# Altium schematic symbol library lib_datalogger.SchLib: 1246 symbols (part 4 of 16) (continued)
## CMP-005-000001-1 (continued)

## CMP-005-00001-4
designator F?, comment MF-MSMF050-2
PTC Resettable Fuse, 15 V, 500 mA, -40 to 85 degC, 2-Pin SMD, RoHS, Tape and Reel; Manufacturer: Bourns; Nominal Supply Voltage: 15V; Current Rating: 100A; Resistance: 150mohm; Datasheet URL: http://www.bourns.com/docs/Product-Datasheets/mfmsmf.pdf; Packaging: TapeandReel; Package Description: 2-Pin Surface Mount Device, Body 4.55 x 3.24 mm; RoHS Compliant: True; Package Quantity: 2000; Lead Pitch: 4.73mm; Datasheet Version: Rev. AG, 08/2016; Max Operating Temperature: 85°C; Voltage Rating: 15V; Mounting Technology: SM; Case/Package: 1812; Min Operating Temperature: -40°C; Package Reference: MF-MSMF050-2
footprint BOUR-MF-MSMF050-2_V (SMD, 2-Leads, Body 4.55x3.24mm)
pins: 1, 2

## CMP-00005-2
designator CLUSTER LED?, comment CLUSTER LED
Round 503-B Series Led -blue Color, Full Rank, Bulk Pack; Lens Color: Colorless; Lens Transparency: Clear; Viewing Angle: 30°; Wavelength: 591nm; Power Dissipation: 130mW; Forward Current: 20mA; Lens Style: Dome,Round; Number of LEDs: 1; Reverse Voltage: 5V; Illumination Color: Orange; Forward Voltage: 2.1V; Dominant Wavelength: 596nm; Luminous Intensity: 6000mcd; REACH SVHC: Unknown; Color: Orange; Packaging: Tape and Reel; Radiation Hardening: No; Mount: Through Hole; Depth: 5.8mm; Case/Package: Radial; Series: -; RoHS Compliant: Yes; Min Operating Temperature: -40°C; Width: 0.5inch; Height: 10.1mm; Package Quantity: 2500; Test Current: 20mA; Number of Pins: 2; Number of Elements: 1; Max Operating Temperature: 100°C; Length: 5.8mm; Weight: 0.01lb
footprint CLUSTER LED-Footprint-1
pins: AC A1, KG1 A2, KG2 B2, KG3 C2, KG4 D2
text: 234R; 127R; 3; 4

## CMP-005-000002-1
designator CON?, comment CONN DG250
PCB Spring Terminal Blocks DG250-5.0; Manufacturer 1: DEGSON; Manufacturer Part Number 1: DG250T-5.0-16P-14-00AH; Reated connection: 2.5 mm²; Reated courent: 12A; Pitch: 5.0 mm²; Ambient trmperature: -40~+95; Reated voltage: 450V; Poles: 2*(1P-XXP); Design Item ID: CONN DG250; Source: mits.SchLib
footprint DG250
footprint DG250
pins: 1, 2, 3, 4, 5, 6, 7, 8, 9, 10, 11, 12, 13, 14

## CMP-005-00002-4
designator F?, comment MF-MSMF075-2
PTC Resettable Fuse, 13.2 V, 750 mA, -40 to 85 degC, 2-Pin SMD, RoHS, Tape and Reel; Manufacturer: Bourns; Resistance: 450mohm; Current Rating: 100A; Voltage Rating: 13.2V; Package Reference: MF-MSMF050-2; Mounting Technology: SM; Max Operating Temperature: 85°C; Package Quantity: 2000; Min Operating Temperature: -40°C; Case/Package: 1812; Packaging: TapeandReel; Package Description: 2-Pin Surface Mount Device, Body 4.55 x 3.24 mm; Lead Pitch: 4.73mm; Nominal Supply Voltage: 13.2V; Datasheet Version: Rev. AG, 08/2016; Datasheet URL: http://www.bourns.com/docs/Product-Datasheets/mfmsmf.pdf; RoHS Compliant: True
footprint BOUR-MF-MSMF050-2_V (SMD, 2-Leads, Body 4.55x3.24mm)
pins: 1, 2

## CMP-005-000003-1
designator CON?, comment CONN XT60 60A
Conector XT60 M 60A; Manufacturer 1: AMASS; Manufacturer Part Number 1: XT60-M; Kind of connector: MALE; Connector series: DC Supply; Design Item ID: CONN XT60 60A; Source: mits.SchLib; Number of pins: 2; Current rating: 60A
footprint MSTBA 2G
footprint XT60 3MM
pins: 1, 2

## CMP-005-00003-4
designator F?, comment MF-MSMF110/24X-2
PTC Resettable Fuse, 24 V, 1.1 A, -40 to 85 degC, 2-Pin SMD, RoHS, Tape and Reel; Manufacturer: Bourns; Resistance: 0.18Ohm; Current Rating: 20A; Nominal Supply Voltage: 24V; Max Operating Temperature: 85°C; Package Description: 2-Pin Surface Mount Device, Body 4.6 x 3.24 mm; Packaging: TapeandReel; Datasheet URL: http://www.bourns.com/docs/Product-Datasheets/mfmsmf.pdf; RoHS Compliant: True; Mounting Technology: SM; Case/Package: 1812; Package Reference: MF-MSMF110-24X-2; Datasheet Version: Rev. AG, 08/2016; Voltage Rating: 24V; Min Operating Temperature: -40°C
footprint BOUR-MF-MSMF110-24X-2_V (Chip Fuse, 2-Leads, Body 4.6x3.24mm)
pins: 1, 2

## CMP-005-000004-1
designator J?, comment CONECTOR USB B
CONN USB RTANG FEMALE TYPE B PCB; Manufacturer: Assmann WSW Components; Part#: AU-Y1007-R; MSRP: 0,36685; eVendor#: AE9925-ND; eVendorPrice: 0,73; eVendor: Digi-Key; Design Item ID: CONECTOR USB B; Source: mits.SchLib; MOQ: 2500; Datasheet: http://www.assmann.us/specs/AU-Y1007-R.pdf
footprint CONECTOR_USB_B_RA (Connector)
footprint CONECTOR_USB_B_RA (Connector)
pins: 1 VBUS, 2 D-, 3 D+, 4 GND, SH SHIELD

## CMP-005-00004-3
designator F?, comment 1812L050PR
POLY-FUSE(R) Resettable PTC, 15 V, 0.5 A, -40 to 85 degC, 2-Pin SMD, RoHS, Tape and Reel; Manufacturer: Littelfuse; Nominal Supply Voltage: 15V; Resistance: 1Ohm; Current Rating: 100A; Min Operating Temperature: -40°C; Package Description: 2-Pin Surface Mount Device, Body 4.55 x 3.24 mm; Package Quantity: 1; RoHS Compliant: True; Datasheet Version: Feb-16; Datasheet URL: http://www.littelfuse.com/~/media/electronics/datasheets/resettable_ptcs/littelfuse_ptc_1812l_datasheet.pdf.pdf; Case/Package: 1812; Packaging: TapeandReel; Voltage Rating: 15V; Max Operating Temperature: 85°C; Package Reference: 1812; Mounting Technology: SM
footprint LFUS-466_V (SMD, 2-Leads, Body 3.175x1.524mm)
footprint LFUS-1812L050_V (Chip Fuse, 2-Leads, Body 4.73x3.41mm)
pins: 1, 2

## CMP-005-000005-1
designator CON?, comment EURO 96 TIPO C
CONN DIN PLUG 64POS RT ANG PCB; Manufacturer Part Number: 5536356-5; Manufacturer: TE Connectivity AMP Connectors; Pitch: 0.100" (2.54mm); Material Flammability Rating: UL94 V-0; Number of Positions Loaded: 64; Material - Insulation: Polymer Thermoplastic, Glass Filled; Level, Class: 2; Connector Type: Plug, Male Pins; Number of Positions: 96; Stock 1: 71; RoHS: RoHS Compliant; Style: C; ComponentLink1URL: http://www.te.com/commerce/DocumentDelivery/DDEController?Action=srchrtrv&DocNm=5536356&DocType=Customer+Drawing&DocLang=English; Design Item ID: EURO 96 TIPO C; Features: Board Lock; Category: Connectors, Interconnects; Packaging: Bulk; Part Status: Active; Pricing 1: 1=5.87, 25=5.86, 50=4.84, 100=4.03, 250=3.46, 500=3.1 (USD); Source: mits.SchLib; Operating Temperature: -55°C ~ 125°C; Number of Rows: 3; Contact Finish Thickness: -; ComponentLink1Description: http://www.te.com/commerce/DocumentDelivery/DDEController?Action=srchrtrv&DocNm=5536356&DocType=Customer+Drawing&DocLang=English; Mounting Type: Through Hole, Right Angle; Current rating: -; Termination: Solder; Contact Finish: Gold
footprint Euro 96-64 RECEPTOR
footprint Euro 96 tipo C
part A pins: a1, a2, a3, a4, a5, a6, a7, a8, a9, a10, a11, a12, a13, a14, a15, a16, a17, a18, a19, a20, a21, a22, a23, a24, a25, a26, a27, a28, a29, a30, a31, a32
part B pins: b1, b2, b3, b4, b5, b6, b7, b8, b9, b10, b11, b12, b13, b14, b15, b16, b17, b18, b19, b20, b21, b22, b23, b24, b25, b26, b27, b28, b29, b30, b31, b32
part C pins: c1, c2, c3, c4, c5, c6, c7, c8, c9, c10, c11, c12, c13, c14, c15, c16, c17, c18, c19, c20, c21, c22, c23, c24, c25, c26, c27, c28, c29, c30, c31, c32

## CMP-005-00005-3
designator F?, comment 1812L075PR
POLY-FUSE(R) Resettable PTC, 13.2 V, 0.75 A, -40 to 85 degC, 2-Pin SMD, RoHS, Tape and Reel; Manufacturer: Littelfuse; Current Rating: 100A; Resistance: 450mohm; Nominal Supply Voltage: 13.2V; Mounting Technology: SM; Min Operating Temperature: -40°C; Package Quantity: 2000; Datasheet URL: http://www.littelfuse.com/~/media/electronics/datasheets/resettable_ptcs/littelfuse_ptc_1812l_datasheet.pdf.pdf; Package Description: 2-Pin Surface Mount Device, Body 4.55 x 3.24 mm; Datasheet Version: Feb-16; RoHS Compliant: True; Packaging: TapeandReel; Package Reference: 1812; Case/Package: 1812; Max Operating Temperature: 85°C
footprint LFUS-466_V (SMD, 2-Leads, Body 3.175x1.524mm)
footprint LFUS-1812L075_V (Chip Fuse, 2-Leads, Body 4.73x3.41mm)
pins: 1, 2

## CMP-005-000006-1
designator CON?, comment CONN BASE NEMA 7POS
LED Lighting Fixture Accessories; LIGHTCONTROLLER BASE ASSEMBLY; 76MM DIA; Manufacturer: TE Connectivity; Manufacturer Part Number: 2213730-1; Sealable: Yes (With); Number of Positions: 7; Connector Type: Plug; Design Item ID: CONN BASE NEMA 7POS; RoHS: Yes; Supplier Unit Price 2: 10.45; Pricing 1: 1=10,95000, 10=7,94200, 100=6,56270, 500=5,91520 (USD); ComponentLink1URL: https://www.te.com/commerce/DocumentDelivery/DDEController?Action=srchrtrv&DocNm=2213730&DocType=Customer+Drawing&DocLang=English&src-supplier=Digi-Key; ComponentLink2URL: http://www.farnell.com/datasheets/2079116.pdf?src-supplier=Element14; ComponentLink2Description: http://www.farnell.com/datasheets/2079116.pdf?src-supplier=Element14; Stock 1: 512; Category: Cables and Wire; Source: mits.SchLib; REACH SVHC: Unknown; ComponentLink1Description: https://www.te.com/commerce/DocumentDelivery/DDEController?Action=srchrtrv&DocNm=2213730&DocType=Customer+Drawing&DocLang=English&src-supplier=Digi-Key
footprint BASE NEMA 7PIN
footprint BASE NEMA 7PIN
pins: 1 BRN, 2 GRAY (-), 3 VIO (+), 4 ORA, 5 LI, 6 LO, 7 N

## CMP-005-00006-3
designator F?, comment 1812L160/12DR
POLY-FUSE(R) Resettable PTC, 12 V, 1.6 A, -40 to 85 degC, 2-Pin SMD, RoHS, Tape and Reel; Manufacturer: Littelfuse; Resistance: 100mohm; Current Rating: 100A; Nominal Supply Voltage: 12V; Max Operating Temperature: 85°C; Case/Package: 1812; Package Quantity: 1500; Datasheet URL: http://www.littelfuse.com/~/media/electronics/datasheets/resettable_ptcs/littelfuse_ptc_1812l_datasheet.pdf.pdf; Package Description: 2-Pin Surface Mount Device, Body 4.55 x 3.24 mm; Package Reference: 1812; Packaging: TapeandReel; Datasheet Version: Feb-16; Min Operating Temperature: -40°C; Mounting Technology: SM; RoHS Compliant: True
footprint LFUS-466_V (SMD, 2-Leads, Body 3.175x1.524mm)
footprint LFUS-1812L16012_V (Chip Fuse, 2-Leads, Body 4.73x3.41mm)
pins: 1, 2

## CMP-005-000007-1
designator CON?, comment CONN HEADER 6POS 2X3
VERTICAL PIN HEADER GOLD+TIN; Manufacturer Part Number: M20-9760342; Manufacturer: Harwin; Connector Type: Male Pin; Max Current Rating: 3A; Contact Resistance: 25mR; Voltage Rating: 750V; Gender: Male; Number of Contacts: 6; Pitch: 2.54mm; Row Spacing: 0.1inch; Source: mits.SchLib; Number of Rows: 2; Contact Material: Brass; Design Item ID: CONN HEADER 6POS 2X3; Mount: Through Hole; Min Operating Temperature: -40°C; Depth: 5.08mm; ComponentLink3URL: https://datasheet.ciiva.com/16733/m20-976-16733096.pdf?src-supplier=Avnet+Europe; ComponentLink1URL: https://datasheet.ciiva.com/26899/getdatasheetpartid-501523-26899404.pdf?src-supplier=Verical; RoHS: Yes; Pricing 1: 1=0,28000, 10=0,25900, 100=0,17940, 500=0,15180, 1000=0,12420, 5000=0,11040, 10000=0,10005 (USD); ComponentLink3Description: https://datasheet.ciiva.com/16733/m20-976-16733096.pdf?src-supplier=Avnet+Europe; Current rating: 3A; Package Quantity: 1000; Packaging: Bag; ComponentLink2Description: https://datasheet.ciiva.com/9479/m20-976-9479738.pdf?src-supplier=Avnet; Contact Plating: Gold; Max Operating Temperature: 105°C; Category: Headers and Wire Housings; Contact Mating Length: 0.228inch; Housing Color: Black; Orientation: Straight; Length: 7.62mm; Number of Positions: 6; Stock 1: 7764; ComponentLink2URL: https://datasheet.ciiva.com/9479/m20-976-9479738.pdf?src-supplier=Avnet; ComponentLink1Description: https://datasheet.ciiva.com/26899/getdatasheetpartid-501523-26899404.pdf?src-supplier=Verical; Radiation Hardening: No; Termination: Solder; Color: Black; Housing Material: Nylon
footprint CONN HEADER 6POS 2X3
pins: 1, 2, 3, 4, 5, 6

## CMP-005-00007-3
designator F?, comment MF-MSMF075
PTC Resettable Fuse, 13.2 V, 100 A, -40 to 85 degC, 2-Pin SMD, RoHS, Tape and Reel; Manufacturer: Bourns; Current Rating: 100A; Package Reference: MF-MSMF075; Mounting Technology: SM; Datasheet URL: http://www.bourns.com/docs/Product-Datasheets/mfmsmf.pdf; Datasheet Version: Rev. AG, 08/2016; RoHS Compliant: False; Package Description: 2-Pin Surface Mount Device, Body 4.55 x 3.24 mm; Case/Package: MF-MSMF075
footprint LFUS-466_V (SMD, 2-Leads, Body 3.175x1.524mm)
footprint BOUR-MF-MSMF075_V (SMD, 2-Leads, Body 4.55x3.24mm)
pins: 1, 2

## CMP-005-000008-1
designator CON?, comment CONN JACK 3.5MM 4CON
Conn Jack 4 Cond 3.5MM R/a; Manufacturer Part Number: 54-00174; Manufacturer: Tensility; Pricing 1: 1=0,77000, 10=0,67900, 25=0,63920, 50=0,61280, 100=0,58610, 250=0,53280 (USD); Stock 1: 5987; Source: mits.SchLib; Design Item ID: CONN JACK 3.5MM 4CON
footprint CONN 4POS JACK
footprint CONN 4POS JACK
pins: 1, 2, 3, 4

## CMP-005-00008-3
designator F?, comment MF-MSMF110/24X
PTC Resettable Fuse, 24 V, 20 A, -40 to 85 degC, 2-Pin SMD, RoHS, Tape and Reel; Manufacturer: Bourns; Current Rating: 20A; Package Description: 2-Pin Surface Mount Device, Body 4.6 x 3.24 mm; Mounting Technology: SM; Datasheet Version: Rev. AG, 08/2016; Package Reference: MF-MSMF110-24X-2; Datasheet URL: http://www.bourns.com/docs/Product-Datasheets/mfmsmf.pdf; Case/Package: MF-MSMF110-24X-2; RoHS Compliant: False
footprint LFUS-466_V (SMD, 2-Leads, Body 3.175x1.524mm)
footprint BOUR-MF-MSMF110-24X-2_V (Chip Fuse, 2-Leads, Body 4.6x3.24mm)
pins: 1, 2

## CMP-005-000009-1
designator CON?, comment CONN KK 4 PIN HEADER
CONN 4 PIN HEADER; Part#: 0470531000; Manufacturer: Molex Inc; eVendor: Digi-Key; MSRP: 0,20355; eVendor#: WM4330-ND; eVendorPrice: 0,43; Datasheet: http://www.molex.com/pdm_docs/sd/470531000_sd.pdf; MOQ: 2500; Obs: --; Design Item ID: CONN KK 4 PIN HEADER; Source: mits.SchLib
footprint CON_4POS_HEADER_RA_4.2MM (METALTEX MFPN-4)
footprint KK4
pins: 1, 2, 3, 4

## CMP-005-00009-4
designator F?, comment MF-MSMF160
PTC Resettable Fuse, 8 V, 100 A, -40 to 85 degC, 2-Pin SMD, RoHS, Tape and Reel; Manufacturer: Bourns; Current Rating: 100A; RoHS Compliant: False; Case/Package: MF-MSMF160; Package Reference: MF-MSMF160; Package Description: 2-Pin Surface Mount Device, Body 4.55 x 3.24 mm; Datasheet Version: Rev. AG, 08/2016; Mounting Technology: SM; Datasheet URL: http://www.bourns.com/docs/Product-Datasheets/mfmsmf.pdf
footprint LFUS-466_V (SMD, 2-Leads, Body 3.175x1.524mm)
footprint BOUR-MF-MSMF160_V (SMD, 2-Leads, Body 4.55x3.24mm)
pins: 1, 2

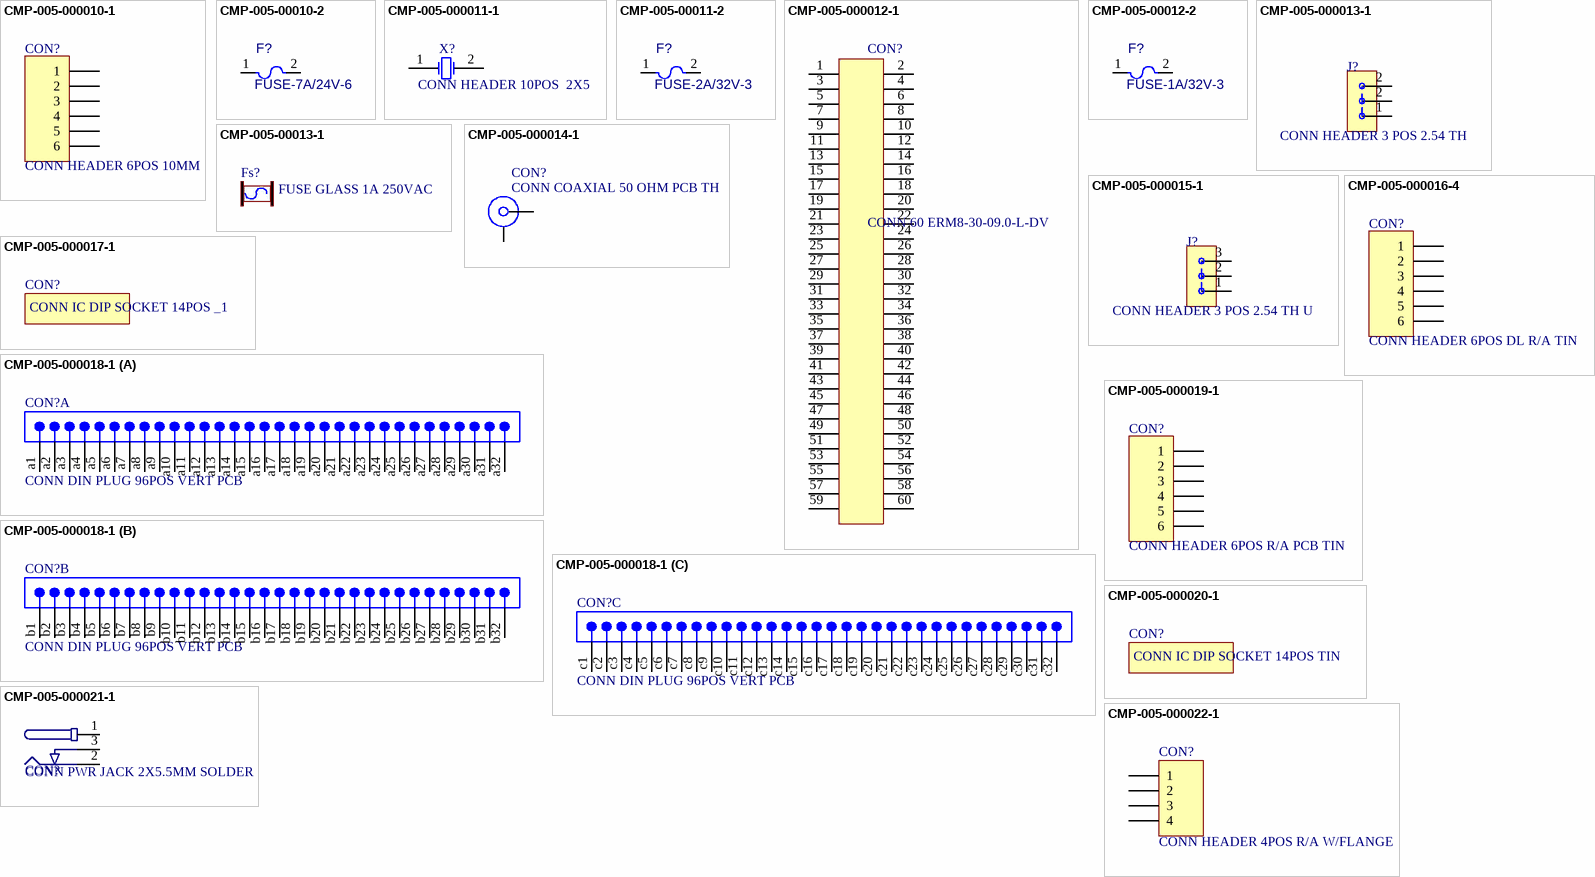
[diagram p11: symbols CMP-005-000010-1 to CMP-005-000022-1]

## CMP-005-000010-1
designator CON?, comment CONN HEADER 6POS 10MM
Conn Board Stacker 6 POS 2.54mm Solder ST Thru-Hole; Manufacturer Part Number: 920-0085-01; Manufacturer: SchmartBoard; Pricing 1: 1=5,00000 (USD); Source: mits.SchLib; RoHS: No; Stock 1: 44; Design Item ID: CONN HEADER 6POS 10MM; ComponentLink1Description: http://www.mouser.com/ds/2/356/schmartboard_pd_920-0085-01_b-539867.pdf?src-supplier=Mouser; ComponentLink1URL: http://www.mouser.com/ds/2/356/schmartboard_pd_920-0085-01_b-539867.pdf?src-supplier=Mouser; Category: Headers and Wire Housings
footprint CONN HEADER 6 POS10MM
pins: 1, 2, 3, 4, 5, 6

## CMP-005-00010-2
designator F?, comment FUSE-7A/24V-6
Surface Mount Fuses 7A 24V VFA SLIMLINE; Current Rating: 7A; Pins: 2
footprint LFUS-466_V (SMD, 2-Leads, Body 3.175x1.524mm)
footprint LFUS-466_V (SMD, 2-Leads, Body 3.175x1.524mm)
pins: 1, 2

## CMP-005-000011-1
designator X?, comment CONN HEADER 10POS  2X5
CONN HDR 10POS 0.05 GOLD PCB; Manufacturer Part Number: 0022112102; Manufacturer: Molex, LLC; Pitch: 0.100" (2.54mm); Number of Positions Loaded: All; Number of Positions: 10; Connector Type: Header, Unshrouded; Contact Finish Thickness: 20µin (0.51µm); ComponentLink3URL: http://www.sullinscorp.com/catalogs/87_Page72-73_HEADER_.050_1.27mm_FEMALE.pdf?src-supplier=Future+Electronics; Contact Finish: Gold; Package Quantity: 1; Category: Connectors, Interconnects; Contact Mating Length: 0.295" (7.49mm); Packaging: Bulk; RoHS: RoHS Compliant; ComponentLink1Description: http://www.molex.com/pdm_docs/sd/022112102_sd.pdf; Lead Free: Lead Free; Mounting Type: Through Hole; Stock 1: 3363; Part Status: Active; Color: White; ComponentLink2Description: https://drawings-pdf.s3.amazonaws.com/10956.pdf?src-supplier=Digi-Key; Features: -; Pricing 1: 1=1.35, 10=1.226, 50=1.1006, 100=1.0506, 250=0.95056, 500=0.87552, 1000=0.75045, 2500=0.70042, 5000=0.6654 (USD); Fastening Type: Friction Lock; ComponentLink1URL: http://www.molex.com/pdm_docs/sd/022112102_sd.pdf; Pricing 2: 1=1,22000, 10=1,10700, 100=0,94880, 500=0,79066, 1000=0,67770, 5000=0,65260 (USD); Contact Type: Male Pin; ComponentLink3Description: http://www.sullinscorp.com/catalogs/87_Page72-73_HEADER_.050_1.27mm_FEMALE.pdf?src-supplier=Future+Electronics; Row Spacing: -; Number of Rows: 1; Stock 2: 3311; ComponentLink2URL: https://drawings-pdf.s3.amazonaws.com/10956.pdf?src-supplier=Digi-Key; Contact Plating: Gold; Mount: Through Hole; Design Item ID: CONN HEADER 10POS  2X5; Termination: Solder; Source: mits.SchLib
footprint CFS206
footprint CONN HEADER 10POS 2X5
pins: 1 OSC1, 2 OSC2

## CMP-005-00011-2
designator F?, comment FUSE-2A/32V-3
Fast Acting Fuse, 2 A, 32 V, -55 to 90 degC, 2-Pin SMD, RoHS, Tape and Reel; Current Rating: 2A; Case/Package: LFUS-467; Mounting Technology: SurfaceMount; Pins: 2
footprint LFUS-466_V (SMD, 2-Leads, Body 3.175x1.524mm)
footprint LFUS-467_V (SMD, 2-Leads, Body 1.6x0.813mm)
pins: 1, 2

## CMP-005-000012-1
designator CON?, comment CONN 60 ERM8-30-09.0-L-DV
Manufacturer: Samtec Inc; eVendorPrice: 6,15; eVendor: Digi-Key; eVendor#: SAM8612CT-ND; Obs: Comprar diretamente coma  SAMTEC; MSRP: 5,264; MOQ: 50; Source: mits.SchLib; Part#: ERM8-30-09.0-L-DV; Datasheet: https://www.samtec.com/technical-specifications/Default.aspx?SeriesMaster=ERM8; Design Item ID: CONN 60 ERM8-30-09.0-L-DV
footprint ERF8-030-07.0-L-DV-TR
footprint ERM8-030-09.0-L-DV
pins: 1, 2, 3, 4, 5, 6, 7, 8, 9, 10, 11, 12, 13, 14, 15, 16, 17, 18, 19, 20, 21, 22, 23, 24, 25, 26, 27, 28, 29, 30, 31, 32, 33, 34, 35, 36, 37, 38, 39, 40, 41, 42, 43, 44, 45, 46, 47, 48, 49, 50, 51, 52, 53, 54, 55, 56, 57, 58, 59, 60

## CMP-005-00012-2
designator F?, comment FUSE-1A/32V-3
Fast Acting Fuse, 1 A, 32 V, -55 to 90 degC, 2-Pin SMD, RoHS, Tape and Reel; Current Rating: 1A; Case/Package: LFUS-467; Pins: 2
footprint LFUS-466_V (SMD, 2-Leads, Body 3.175x1.524mm)
footprint LFUS-467_V (SMD, 2-Leads, Body 1.6x0.813mm)
pins: 1, 2

## CMP-005-000013-1
designator J?, comment CONN HEADER 3 POS 2.54 TH  (no BOM)
CONN HEADER 3 POS 2.54; Manufacturer: Wurth Electronics Inc; Manufacturer Part Number: 61300311121; Number of Positions Loaded: All; Connector Type: Header, Unshrouded; Number of Positions: 3; Pitch: 0.100" (2.54mm); ComponentLink1URL: http://katalog.we-online.de/em/datasheet/6130xx11121.pdf; Stock 1: 17095; Contact Finish: Gold; Source: mits.SchLib; Termination: Solder; RoHS: RoHS Compliant; Row Spacing: -; Category: Connectors, Interconnects; Contact Finish Thickness: -; Packaging: Bulk; Fastening Type: -; Number of Rows: 1; Contact Mating Length: 0.236" (6.00mm); Contact Type: Male Pin; Design Item ID: CONN HEADER 3 POS 2.54 TH; Features: -; Color: Black; Mounting Type: Through Hole; Pricing 1: 1=0.13, 10=0.106, 25=0.088, 50=0.074, 100=0.067, 1000=0.061 (USD); Part Status: Active; ComponentLink1Description: http://katalog.we-online.de/em/datasheet/6130xx11121.pdf
footprint JUMPER 3POS 2.54MM (Chip Resistor; Body 1.6 x 0.8 mm (LxW typ))
footprint JUMPER 3POS 2.54MM (Chip Resistor; Body 1.6 x 0.8 mm (LxW typ))
pins: 1, 2, 2

## CMP-005-00013-1
designator Fs?, comment FUSE GLASS 1A 250VAC
FUSE GLASS 1A 250VAC 5X20MM; Manufacturer Part  Number: 5ET1-R; Voltage Rating (AC): 250V; Approvals: CSA,VDE,CE,cURus,CCC,SEMKO; Fuse Type: Cartridge, Glass; DC Cold Resistance: 110mR; Diameter: 5.1mm; Mount: Holder; Packaging: Bulk; Number of Pins: 2; Voltage Rating (DC): 250V; Voltage Rating: 250V; Contact Plating: Nickel; Series: 5ET; Length: 0.787inch; Current Rating: 1A; RoHS Compliant: Yes; Lead Free: Lead Free; Min Operating Temperature: -55°C; Max Operating Temperature: 125°C
footprint FUSE
footprint FUSE

## CMP-005-000014-1
designator CON?, comment CONN COAXIAL 50 OHM PCB TH
Manufacturer Part Number: 5-1814832-2; Manufacturer: TE Connectivity AMP; Source: mits.SchLib; RoHS: Yes; Stock 1: 5601; Pricing 1: 1=1,99080, 10=1,53800, 30=1,42470, 100=1,27610, 500=1,20770, 1000=1,19830, 1=1,91630, 10=1,48040, 30=1,37140, 100=1,22840, 500=1,16250, 1000=1,15350, 1=10,00000, 10=7,72540, 30=7,15640, 100=6,41000, 500=6,06640, 1000=6,01910, 1=9,61310, 10=7,42650, 30=6,87950, 100=6,16200, 500=5,83170, 1000=5,78620, 1=1,29270, 10=0,99870, 30=0,92510, 100=0,82860, 500=0,78420, 1000=0,77810, 1=1,10500, 10=0,85370, 30=0,79080, 100=0,70830, 500=0,67040, 1000=0,66510, 1=11,83140, 10=9,14020, 30=8,46700, 100=7,58390, 500=7,17740, 1000=7,12140, 1=167,21530, 10=129,17980, 30=119,66550, 100=107,18480, 500=101,43880, 1000=100,64780, 1=6,30710, 10=4,87250, 30=4,51360, 100=4,04280, 500=3,82610, 1000=3,79630, 1=115,14000, 10=88,94980, 30=82,39850, 100=73,80460, 500=69,84810, 1000=69,30340, 1=13,21800, 10=10,21140, 30=9,45930, 100=8,47270, 500=8,01850, 1000=7,95600, 1=2,05180, 10=1,58510, 30=1,46840, 100=1,31520, 500=1,24470, 1000=1,23500, 1=1,52200, 10=1,17580, 30=1,08920, 100=0,97560, 500=0,92330, 1000=0,91610 (AUD); Design Item ID: CONN COAXIAL 50 OHM PCB TH
footprint CON-SMA-TH_5-1814832-2-LORA - RIGHT - ANGLE
footprint CON-SMA-TH_5-1814832-2
pins: 1 "PAD", 2 "PAD"

## CMP-005-000015-1
designator J?, comment CONN HEADER 3 POS 2.54 TH U  (no BOM)
CONN HEADER 3 POS 2.54; Manufacturer: Wurth Electronics Inc; Manufacturer Part Number: 61300311121; Number of Positions Loaded: All; Pitch: 0.100" (2.54mm); Number of Positions: 3; Connector Type: Header, Unshrouded; Number of Rows: 1; Source: mits.SchLib; Stock 1: 17095; Features: -; Contact Finish: Gold; Category: Connectors, Interconnects; Packaging: Bulk; Contact Mating Length: 0.236" (6.00mm); Part Status: Active; Fastening Type: -; Row Spacing: -; Termination: Solder; Contact Type: Male Pin; RoHS: RoHS Compliant; Color: Black; Design Item ID: CONN HEADER 3 POS 2.54 TH U; Contact Finish Thickness: -; ComponentLink1URL: http://katalog.we-online.de/em/datasheet/6130xx11121.pdf; ComponentLink1Description: http://katalog.we-online.de/em/datasheet/6130xx11121.pdf; Pricing 1: 1=0.13, 10=0.106, 25=0.088, 50=0.074, 100=0.067, 1000=0.061 (USD); Mounting Type: Through Hole
footprint JUMPER 3POS 2.54MM U (Chip Resistor; Body 1.6 x 0.8 mm (LxW typ))
footprint JUMPER 3POS 2.54MM U (Chip Resistor; Body 1.6 x 0.8 mm (LxW typ))
pins: 1, 2, 3

## CMP-005-000016-4
designator CON?, comment CONN HEADER 6POS DL R/A TIN
Manufacturer: Molex, LLC; Manufacturer Part Number: 0039291067; Number of Positions Loaded: All; Row Spacing: 0.165" (4.20mm); Connector Type: Header, Shrouded; Number of Positions: 6; Mounting Type: Through Hole, Right Angle; Category: Connectors, Interconnects; Fastening Type: Locking Ramp; Stock 1: 2015; Features: Mounting Flange; Source: mits.SchLib; Design Item ID: CONN HEADER 6POS DL R/A TIN; Number of Rows: 2; Contact Type: Male Pin; Packaging: Bulk; Part Status: Active; Color: Natural; ComponentLink1URL: http://www.molex.com/pdm_docs/sd/039291067_sd.pdf; Pricing 1: 1=1.37, 10=1.206, 25=1.1356, 50=1.0882, 100=1.0408, 250=0.9462, 500=0.85158, 1000=0.75696, 2500=0.686 (USD); Contact Finish Thickness: 100µin (2.54µm); Contact Mating Length: -; Pitch: 0.165" (4.20mm); Termination: Solder; ComponentLink1Description: http://www.molex.com/pdm_docs/sd/039291067_sd.pdf; Contact Finish: Tin; RoHS: RoHS Compliant
footprint CONN_HEADER_6POS_RA_4.2MM_MOUNTING_FLANGE
pins: 1, 2, 3, 4, 5, 6

## CMP-005-000017-1
designator CON?, comment CONN IC DIP SOCKET 14POS _1
DIP Socket, 2.54 mm,  7.62 mm, 14POS; Manufacturer Part Number: AR 14 HZL-TT; Manufacturer: On Shore Technology Inc; Part#: ED14DT; Voltage Rating (DC): 150V; eVendorPrice: 0,18; Connector Type: DIP,Socket; Contact Resistance: 4mR; eVendor: Digi-Key; Number of Positions: 14; Row Spacing: 7.62mm; Insulation Resistance: 1GR; Pitch: 2.54mm; eVendor#: ED3045-5-ND; Voltage Rating (AC): 100V; MSRP: 0,07360; Current rating: 3A; MOQ: 5000; Pricing 2: 1=0,73000, 10=0,64000, 25=0,60240, 50=0,57740, 100=0,55220, 250=0,50200, 500=0,45180, 1000=0,40160, 2500=0,36395 (USD); Contact Material: Brass,Bronze; ComponentLink6Description: http://docs-europe.electrocomponents.com/webdocs/0da4/0900766b80da42ae.pdf?src-supplier=Allied+Electronics; ComponentLink3Description: https://media.digikey.com/pdf/Data%20Sheets/Assmann%20PDFs/ARxx-HxL-TT,xx-R.pdf?src-supplier=Digi-Key; Package Quantity: 33; ComponentLink8URL: https://datasheet.ciiva.com/15199/getdatasheetpartid-103305-15199532.pdf?src-supplier=Verical; Orientation: Straight; Radiation Hardening: No; ComponentLink4URL: https://www.verical.com/server-webapp/html/getDatasheet?partID=409251&src-supplier=Verical; Min Operating Temperature: -40°C; Number of Rows: 2; Depth: 10.6mm; ComponentLink7Description: https://datasheet.ciiva.com/16322/110-44-314-41-001000-16322185.pdf?src-supplier=Future+Electronics; Packaging: Rail/Tube; Contact Plating: Tin,Gold; ComponentLink8Description: https://datasheet.ciiva.com/15199/getdatasheetpartid-103305-15199532.pdf?src-supplier=Verical; Length: 17.78mm; Category: Connectors; ComponentLink1Description: http://uk.rs-online.com/webdocs/0da4/0900766b80da42ae.pdf?src-supplier=RSComponents; Insulation Material: Polyamide; Stock 1: 10176; Number of pins: 14; ComponentLink2URL: http://components.arrow.com/part/dataview/0323_03822737?src-supplier=Arrow+Europe; ComponentLink4Description: https://www.verical.com/server-webapp/html/getDatasheet?partID=409251&src-supplier=Verical; ComponentLink5Description: http://www.assmann-wsw.com/fileadmin/datasheets/ASS_4852_CO.pdf?src-supplier=Digi-Key; ComponentLink5URL: http://www.assmann-wsw.com/fileadmin/datasheets/ASS_4852_CO.pdf?src-supplier=Digi-Key; ComponentLink10URL: https://datasheet.ciiva.com/1101/1726388-1101579.pdf?src-supplier=Newark; Width: 10.16mm; Obs: --; REACH SVHC: No SVHC; Material: PBT; Pricing 1: 1=0,79000, 10=0,69400, 25=0,65280, 50=0,62560, 100=0,59840, 250=0,54400, 500=0,48960, 1000=0,43520, 2500=0,39440 (USD); Case/Package: DIP; Lead Free: Contains Lead; ComponentLink10Description: https://datasheet.ciiva.com/1101/1726388-1101579.pdf?src-supplier=Newark; Number of Contacts: 14; Source: mits.SchLib; ComponentLink3URL: https://media.digikey.com/pdf/Data%20Sheets/Assmann%20PDFs/ARxx-HxL-TT,xx-R.pdf?src-supplier=Digi-Key; Max Operating Temperature: 105°C; ComponentLink2Description: http://components.arrow.com/part/dataview/0323_03822737?src-supplier=Arrow+Europe; Termination: Solder; ComponentLink1URL: http://uk.rs-online.com/webdocs/0da4/0900766b80da42ae.pdf?src-supplier=RSComponents; Voltage Rating: 100V; Housing Material: Polyester; ComponentLink6URL: http://docs-europe.electrocomponents.com/webdocs/0da4/0900766b80da42ae.pdf?src-supplier=Allied+Electronics; RoHS: No; Datasheet: http://www.on-shore.com/sites/default/files/manuals/ipg2.pdf; Flammability Rating: UL94 V-0; Mount: Through Hole; ComponentLink7URL: https://datasheet.ciiva.com/16322/110-44-314-41-001000-16322185.pdf?src-supplier=Future+Electronics; Height: 3mm; ComponentLink9URL: https://datasheet.ciiva.com/8015/1734584-8015898.pdf?src-supplier=Element14; ComponentLink9Description: https://datasheet.ciiva.com/8015/1734584-8015898.pdf?src-supplier=Element14; Design Item ID: CONN IC DIP SOCKET 14POS _1; Stock 2: 4617
footprint SOCKET DIP-14 (DIP; 16 Leads; Row Spacing 7.62 mm; Pitch 2.54 mm)
footprint SOCKET DIP-14 WITHOUTPAD (DIP; 16 Leads; Row Spacing 7.62 mm; Pitch 2.54 mm)

## CMP-005-000018-1
designator CON?, comment CONN DIN PLUG 96POS VERT PCB
Manufacturer Part Number: 5650889-5; Manufacturer: TE Connectivity AMP Connectors; Material - Insulation: Polymer Thermoplastic, Glass Filled; Material Flammability Rating: UL94 V-0; Style: R; Number of Positions Loaded: All; Pitch: 0.100" (2.54mm); Connector Type: Plug, Male Pins; Level, Class: 2; Number of Positions: 96; Operating Temperature: -55°C ~ 125°C; Pricing 1: 1=5.33, 10=5.112, 50=4.473, 100=4.26, 250=3.72752, 500=3.621, 1000=3.0885, 2500=2.8755 (USD); RoHS: RoHS Compliant; Termination: Press-Fit; Category: Connectors, Interconnects; Contact Finish Thickness: -; Stock 1: 1721; Source: mits.SchLib; Contact Finish: Gold; ComponentLink1URL: http://www.te.com/commerce/DocumentDelivery/DDEController?Action=srchrtrv&DocNm=5650889&DocType=Customer+Drawing&DocLang=English; Features: -; Packaging: Bulk; ComponentLink1Description: http://www.te.com/commerce/DocumentDelivery/DDEController?Action=srchrtrv&DocNm=5650889&DocType=Customer+Drawing&DocLang=English; Design Item ID: CONN DIN PLUG 96POS VERT PCB; Number of Rows: 3; Part Status: Active; Mounting Type: Through Hole; Current rating: -
footprint Euro 96-64 RECEPTOR
footprint Euro 96 tipo C MALE
part A pins: a1, a2, a3, a4, a5, a6, a7, a8, a9, a10, a11, a12, a13, a14, a15, a16, a17, a18, a19, a20, a21, a22, a23, a24, a25, a26, a27, a28, a29, a30, a31, a32
part B pins: b1, b2, b3, b4, b5, b6, b7, b8, b9, b10, b11, b12, b13, b14, b15, b16, b17, b18, b19, b20, b21, b22, b23, b24, b25, b26, b27, b28, b29, b30, b31, b32
part C pins: c1, c2, c3, c4, c5, c6, c7, c8, c9, c10, c11, c12, c13, c14, c15, c16, c17, c18, c19, c20, c21, c22, c23, c24, c25, c26, c27, c28, c29, c30, c31, c32

## CMP-005-000019-1
designator CON?, comment CONN HEADER 6POS R/A PCB TIN
Manufacturer: TE Connectivity AMP Connectors; Manufacturer Part Number: 1-794528-1; Number of Positions: 6; Pitch: 0.165" (4.20mm); Connector Type: Header, Shrouded; Number of Positions Loaded: All; Contact Type: Male Pin; Category: Connectors, Interconnects; Part Status: Active; RoHS: RoHS Compliant; Mounting Type: Through Hole, Right Angle; Contact Finish: Tin; Fastening Type: Locking Ramp; Packaging: Tray; Contact Mating Length: -; Pricing 1: 1=1.01, 10=0.889, 50=0.8022, 100=0.7673, 250=0.69752, 500=0.62776, 1000=0.558, 2500=0.50569, 5000=0.48825 (USD); Stock 1: 609; Features: Board Lock; Termination: Solder; Contact Finish Thickness: 150µin (3.81µm); ComponentLink1Description: http://www.te.com/commerce/DocumentDelivery/DDEController?Action=srchrtrv&DocNm=794528&DocType=Customer+Drawing&DocLang=English; Number of Rows: 2; Row Spacing: 0.165" (4.20mm); Design Item ID: CONN HEADER 6POS R/A PCB TIN; Source: mits.SchLib; Color: Natural; ComponentLink1URL: http://www.te.com/commerce/DocumentDelivery/DDEController?Action=srchrtrv&DocNm=794528&DocType=Customer+Drawing&DocLang=English
footprint CONN_HEADER_6POS_RA_4.2MM_BOARD_LOCK
pins: 1, 2, 3, 4, 5, 6